# Altium footprint library LUMI_Standard_Auto_Soldering_LIB.PcbLib: 344 footprints (part 19 of 22)
Each footprint in its own frame and in the unit in brackets; x right, y up, seen from the top. Pads: shape width x height; smd on the part's side, far side on the other; paste and mask are expansions set on the pad; w line width, h text height; cw(c..) or ccw(c..) is an arc to the next point about the centre after c.
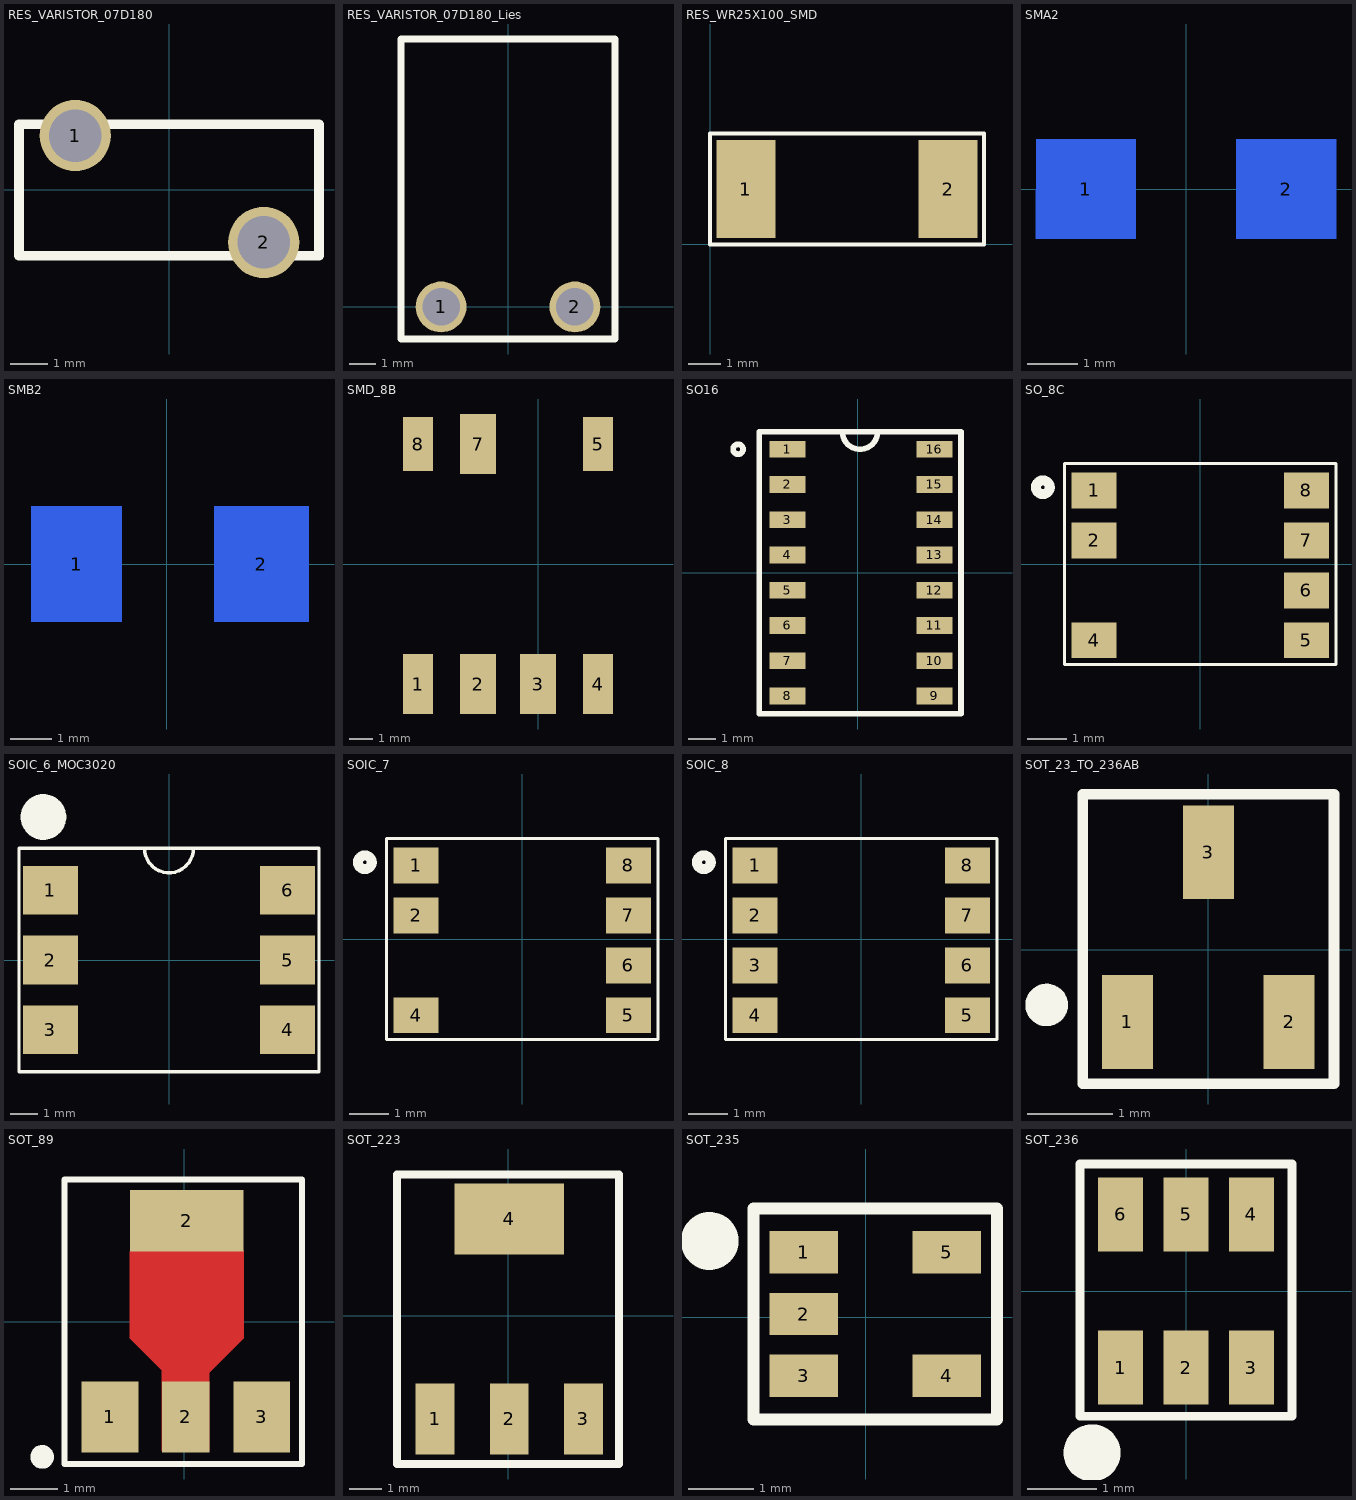
[diagram p18: the footprints below, top view; thin cyan lines are the x and y axes]

## RES_VARISTOR_07D180 [mm]
pads (2):
  round 1.9 hole 1.4 mask+0.07: 1(-2.5,1.45) 2(2.525,-1.4)
Top Overlay:
  lines w0.254: -4,-1.75 4,-1.75 4,1.75 -4,1.75 -4,-1.75
3D body: height 1.5, standoff -6.5, extent 1.93,-1.999 3.125,-0.801
3D body: height 1.5, standoff -6.5, extent -3.095,0.851 -1.9,2.049
3D body: height 7.97, standoff 0, extent -3.992,-1.8 3.992,1.7

## RES_VARISTOR_07D180_Lies [mm]
pads (2):
  round 1.9 hole 1.4 mask+0.07: 1(-2.5,0) 2(2.5,0)
Top Overlay:
  lines w0.254: -4,-1.2 4,-1.2 4,10 -4,10 -4,-1.2
3D body: height 3.5, standoff 0, extent -4,0 4,10
3D body: height 1.5, standoff -6.5, extent -3.095,-0.599 -1.9,0.599
3D body: height 1.5, standoff -6.5, extent 1.905,-0.599 3.1,0.599

## RES_WR25X100_SMD [mm]
pads (2):
  rect 1.8x3 smd: 1(1.1,1.7) 2(7.3,1.7)
Top Overlay:
  lines w0.127: 0,0 0,3.4 8.4,3.4 8.4,0 0,0
3D body: height 0.55, standoff 0, extent 1.05,0.15 7.35,3.25
3D body: height 0.6, standoff 0, extent 0.9,0.2 1.2,3.2
3D body: height 0.6, standoff 0, extent 7.15,0.2 7.45,3.2

## SMA2 [mm]
pads (2):
  rect 2x2 smd far side: 1(-2.016,0) 2(2,0)
Bottom Overlay:
  lines w0.05: -1,-1 -1,1 ; 1,-1 1,1 ; -3,-1 3,-1 3,1 -3,1 -3,-1
3D body: height 1.87, standoff -0.33, extent -2.5,-1.35 2.5,1.35

## SMB2 [mm]
pads (2):
  rect 2.2x2.8 smd far side: 1(-2.2,0)
  rect 2.3x2.8 smd far side: 2(2.3,0)
Bottom Overlay:
  lines w0.05: -1.1,-1.4 -1.1,1.4 ; 1.1,-1.4 1.1,1.4 ; -3.3,-1.4 -3.3,1.4 3.5,1.4 3.5,-1.4 -3.3,-1.4
3D body: height -0.4, standoff -2.7, extent -2.6,-1.8 2.8,1.8

## SMD_8B [mil]
pads (7):
  rect 50x100 smd: 1(-200,-200) 4(100,-200)
  rect 60x100 smd: 2(-100,-200) 3(0,-200) 7(-100,200)
  rect 50x90 smd: 5(100,200) 8(-200,200)
3D body: height 200, standoff 0, extent -240.16,-202.76 150,202.76

## SO16 [mm]
pads (16):
  rect 1.3x0.6 smd: 1(-2.54,4.445) 2(-2.54,3.175) 3(-2.54,1.905) 4(-2.54,0.635) 5(-2.54,-0.635) 6(-2.54,-1.905) 7(-2.54,-3.175) 8(-2.54,-4.445) 9(2.76,-4.445) 10(2.76,-3.175) 11(2.76,-1.905) 12(2.76,-0.635) 13(2.76,0.635) 14(2.76,1.905) 15(2.76,3.175) 16(2.76,4.445)
Top Overlay:
  circle w0.203: c-4.318,4.445 r0.18
  lines w0.203: -0.559,5.08 ccw(c0.076,5.08) 0.711,5.08 ; 3.683,-5.08 -3.556,-5.08 -3.556,5.08 3.683,5.08 ; 3.713,-5.08 3.713,5.08
3D body: height 1.75, standoff 0, extent -2.949,-5 3.051,5

## SO_8C [mm]
pads (7):
  rect 1.14x0.91 smd: 1(-2.705,1.87) 2(-2.705,0.6) 4(-2.705,-1.94) 5(2.695,-1.94) 6(2.695,-0.67) 7(2.695,0.6) 8(2.695,1.87)
Top Overlay:
  circle w0.254: c-4.005,1.95 r0.175
  lines w0.076: -3.455,-2.55 -3.455,2.55 3.445,2.55 3.445,-2.55 -3.455,-2.55
3D body: height 1.75, standoff 0, extent -3.006,-2.5 3.006,2.5

## SOIC_6_MOC3020 [mm]
pads (6):
  rect 2x1.78 smd: 1(-4.318,2.54) 2(-4.318,0) 3(-4.318,-2.54) 4(4.318,-2.54) 5(4.318,0) 6(4.318,2.54)
Top Overlay:
  circle w0.889: c-4.572,5.207 r0.388
  lines w0.127: -0.889,4.064 ccw(c0,4.064) 0.889,4.065 ; -5.461,-4.065 5.461,-4.065 5.461,4.065 -5.461,4.065 -5.461,-4.065
3D body: height 5, standoff 0, extent -3.048,-4.064 3.048,4.064
3D body: height 0.3, standoff 0, extent -4.5,1.75 -3,3.25
3D body: height 0.3, standoff 0, extent -4.5,-0.75 -3,0.75
3D body: height 0.3, standoff 0, extent -4.5,-3.25 -3,-1.75
3D body: height 0.3, standoff 0, extent 3,-3.25 4.5,-1.75
3D body: height 0.3, standoff 0, extent 3,-0.75 4.5,0.75
3D body: height 0.3, standoff 0, extent 3,1.75 4.5,3.25

## SOIC_7 [mm]
pads (7):
  rect 1.14x0.91 smd: 1(-2.705,1.87) 2(-2.705,0.6) 4(-2.705,-1.94) 5(2.695,-1.94) 6(2.695,-0.67) 7(2.695,0.6) 8(2.695,1.87)
Top Overlay:
  circle w0.254: c-4.005,1.95 r0.175
  lines w0.076: -3.455,-2.55 -3.455,2.55 3.445,2.55 3.445,-2.55 -3.455,-2.55
3D body: height 1.75, standoff 0, extent -3.006,-2.5 3.006,2.5

## SOIC_8 [mm]
pads (8):
  rect 1.14x0.91 smd: 1(-2.7,1.87) 2(-2.7,0.6) 3(-2.7,-0.67) 4(-2.7,-1.94) 5(2.7,-1.94) 6(2.7,-0.67) 7(2.7,0.6) 8(2.7,1.87)
Top Overlay:
  circle w0.254: c-4,1.95 r0.175
  lines w0.076: -3.45,-2.55 -3.45,2.55 3.45,2.55 3.45,-2.55 -3.45,-2.55
3D body: height 1.75, standoff 0, extent -3,-2.5 3.011,2.5

## SOT_23_TO_236AB [mm] "SOT23 OR TO-236AB"
pads (3):
  rect 0.6x1.1 smd: 1(-0.95,-0.85) 2(0.95,-0.85) 3(0,1.143)
Top Overlay:
  circle w0.25: c-1.9,-0.65 r0.125
  lines w0.127: -1.475,-1.575 -1.475,1.825 1.475,1.825 1.475,-1.575 -1.475,-1.575
3D body: height 1, standoff 0, extent -1.46,-1.027 1.46,1.313

## SOT_89 [mm]
pads (4):
  rect 1.2x1.5 smd: 1(-1.57,-2.006) 3(1.63,-2.006)
  rect 1x1.5 smd: 2(0.03,-2.006)
  rect 2.4x1.3 smd: 2(0.05,2.125)
Top Layer:
  region: 1.25,1.5 1.25,-0.35 0.525,-1.075 0.525,-2.725 -0.475,-2.725 -0.475,-1.025 -1.15,-0.35 -1.15,1.475 -0.95,1.675 1.075,1.675
Top Overlay:
  circle w0.25: c-3,-2.85 r0.125
  lines w0.127: -2.525,-3 2.475,-3 2.475,-2.625 2.475,3 2.05,3 -2.525,3 -2.525,2.525 -2.525,-3
Top Paste:
  region: 1.25,1.5 1.25,-0.35 0.525,-1.075 0.525,-2.725 -0.475,-2.725 -0.475,-1.025 -1.15,-0.35 -1.15,1.475 -0.95,1.675 1.075,1.675
Top Solder:
  region: 1.25,1.5 1.25,-0.35 0.525,-1.075 0.525,-2.725 -0.475,-2.725 -0.475,-1.025 -1.15,-0.35 -1.15,1.475 -0.95,1.675 1.075,1.675
3D body: height 1.4, standoff 0, extent -2.296,-2.413 2.204,1.522

## SOT_223 [mm]
pads (4):
  rect 1.2x2.2 smd: 1(-2.275,-3.2) 2(0.025,-3.2) 3(2.325,-3.2)
  rect 3.4x2.2 smd: 4(0.025,3)
Top Overlay:
  lines w0.254: -3.45,-4.6 3.425,-4.6 3.425,4.375 -3.45,4.375 -3.45,-4.6
3D body: height 1.74, standoff 0.06, extent -3.25,-3.48 3.25,3.48

## SOT_235 [mm]
pads (5):
  rect 1.06x0.65 smd: 1(-0.95,1) 2(-0.95,0.05) 3(-0.95,-0.9) 4(1.25,-0.9) 5(1.25,1)
Top Overlay:
  circle w0.5: c-2.4,1.175 r0.195
  lines w0.191: -1.725,-1.575 -1.725,1.675 2.025,1.675 2.025,-1.575 -1.725,-1.575
3D body: height 1.3, standoff 0, extent -1.35,-1.45 1.65,1.55

## SOT_236 [mm]
pads (6):
  rect 0.65x1.06 smd: 1(-0.94,-1.1) 2(0,-1.1) 3(0.94,-1.1) 4(0.94,1.1) 5(0,1.1) 6(-0.94,1.1)
Top Overlay:
  circle w0.5: c-1.35,-2.325 r0.16
  lines w0.127: -1.525,-1.8 1.525,-1.8 1.525,1.825 -1.525,1.825 -1.525,-1.8
3D body: height 1, standoff 0, extent -1.46,-1.17 1.46,1.17